# Altium footprint library PCB_PASSIVE.PcbLib: 100 footprints (part 3 of 7)
Each footprint in its own frame and in the unit in brackets; x right, y up, seen from the top. Pads: shape width x height; smd on the part's side, far side on the other; paste and mask are expansions set on the pad; w line width, h text height; cw(c..) or ccw(c..) is an arc to the next point about the centre after c.
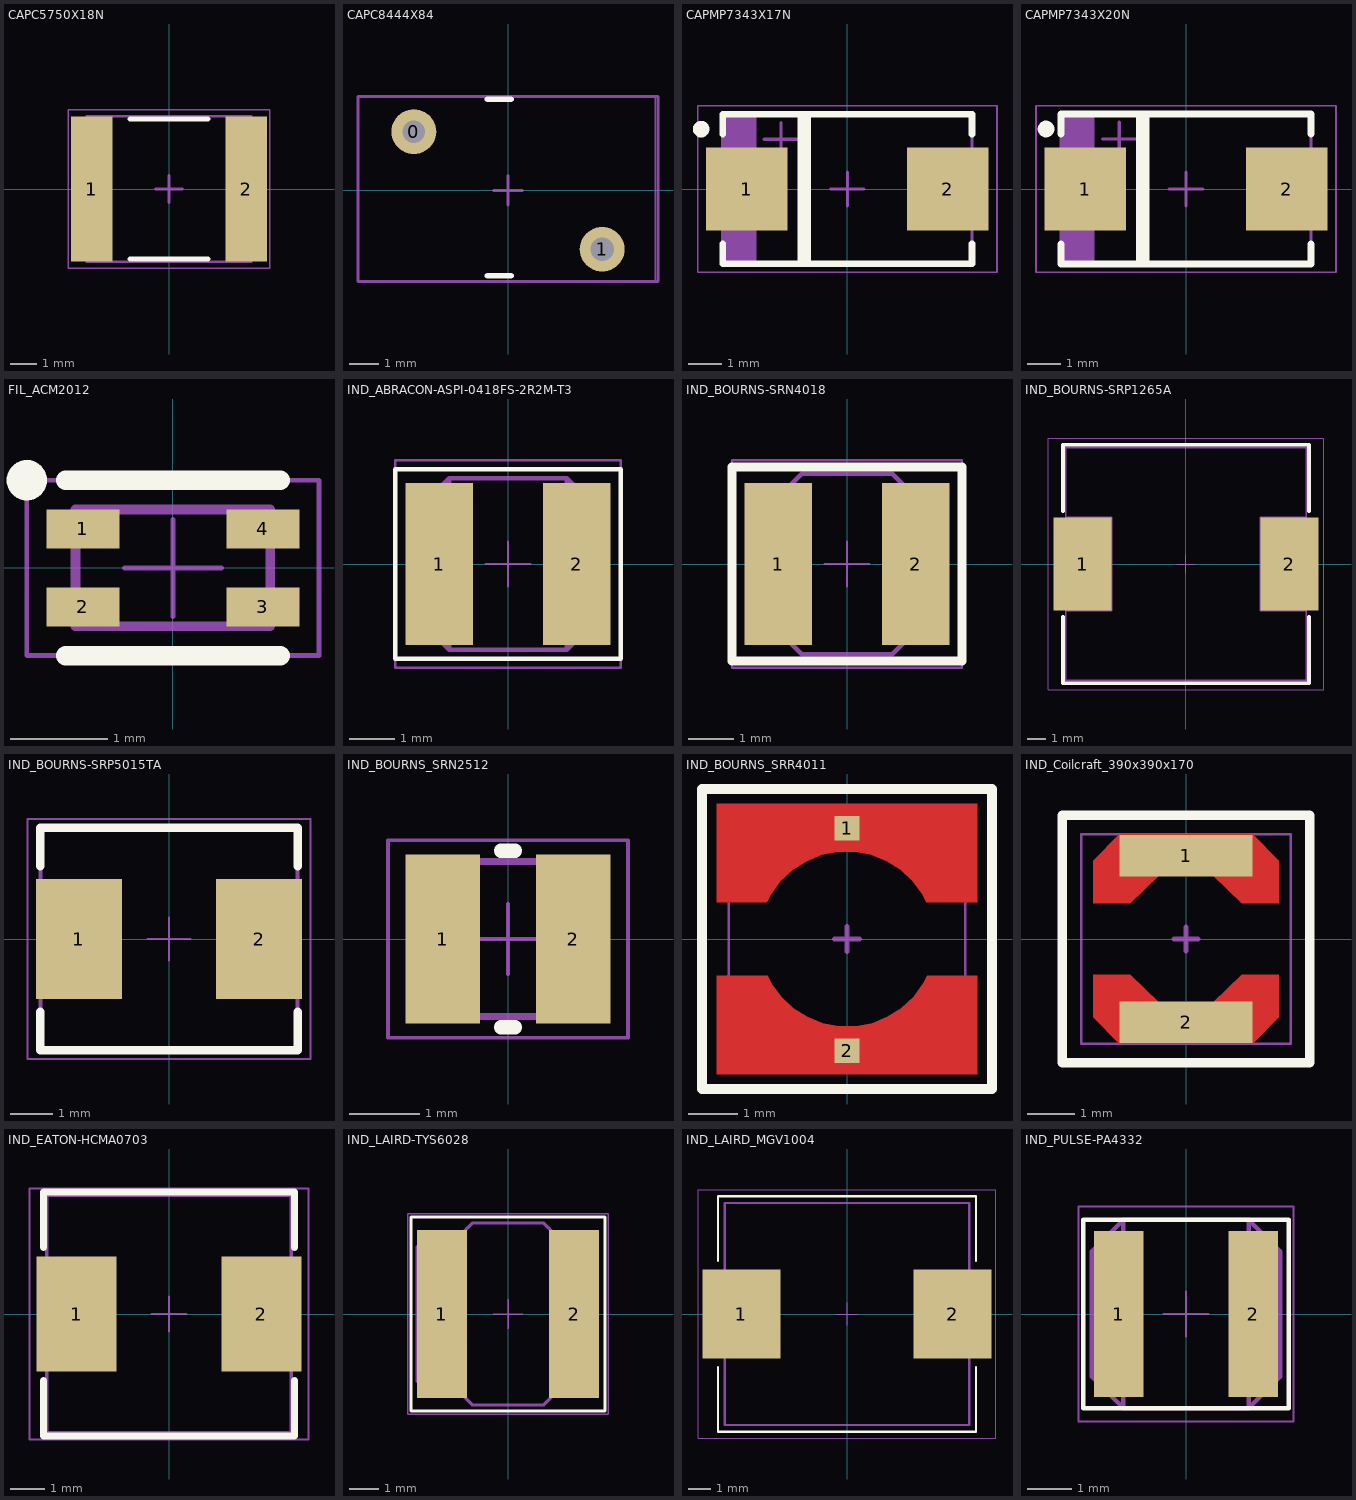
[diagram p2: the footprints below, top view; thin cyan lines are the x and y axes]

## CAPC5750X18N [mm] "Chip Capacitor, 2-Leads, Body 5,70x5,00mm, IPC Medium Density"
height 1.8
pads (2):
  rect 1.55x5.4 smd: 1(-2.875,0) 2(2.875,0)
Top Overlay:
  lines w0.2: -1.45,-2.6 1.45,-2.6 ; -1.45,2.6 1.45,2.6
Mechanical 11:
  text ".Designator" at -0.875,-0.525 h1
Mechanical 14:
  lines w0.1: -2.425,-2.7 -2.425,2.7 ; 2.425,-2.7 2.425,2.7 ; -3.05,-2.7 -3.05,2.7 3.05,2.7 3.05,-2.7 -3.05,-2.7
Mechanical 15:
  lines w0.05: -3.75,-2.95 -3.75,2.95 3.75,2.95 3.75,-2.95 -3.75,-2.95
  lines w0.1: -0.5,0 0.5,0 ; 0,-0.5 0,0.5
3D body "CAPC5750X18N.step": height 1.8, standoff 0, extent -3.05,-2.7 3.05,2.7

## CAPC8444X84 [mm]
pads (2):
  round 1.524 hole 0.762: 0(-3.2,2)
  round 1.524 hole 0.8: 1(3.2,-2)
Top Overlay:
  lines w0.2: -0.7,-2.9 0.1,-2.9 ; -0.7,3.1 0.1,3.1
Mechanical 11:
  text ".Bad" at -2.475,1.9 h1
Mechanical 14:
  lines w0.1: -5.1,-3.1 -5.1,3.2 5.1,3.2 5.1,-3.1 -5.1,-3.1
Mechanical 15:
  lines w0.05: -5.1,-3.1 -5.1,3.2 5,3.2 5,-3.1 -5.1,-3.1
  lines w0.1: -0.5,0 0.5,0 ; 0,-0.5 0,0.5

## CAPMP7343X17N [mm] "Molded Capacitor, 2-Leads, Body 7,30x4,30mm, IPC Medium Density"
height 1.7
pads (2):
  rect 2.45x2.5 smd: 1(-3.025,0) 2(3.025,0)
Top Overlay:
  circle w0.25: c-4.4,1.8 r0.125
  lines w0.2: -3.75,-1.65 -3.75,-2.25 3.75,-2.25 3.75,-1.65 ; -3.75,1.65 -3.75,2.25 3.75,2.25 3.75,1.65 ; -1.4,-2.2 -1.4,2.25 ; -1.2,-2.25 -1.2,2.25
Mechanical 11:
  text ".Designator" at -2.3,1.95 h1
Mechanical 14:
  rectangle: -3.75,-2.25 -2.741,2.25
  lines w0.1: -2.5,1.5 -2,1.5 ; -2,1 -2,1.5 ; -2,2 -2,1.5 ; -1.5,1.5 -2,1.5 ; -3.75,-2.25 -3.75,2.25 3.75,2.25 3.75,-2.25 -3.75,-2.25
Mechanical 15:
  lines w0.05: -4.5,-2.5 -4.5,2.5 4.5,2.5 4.5,-2.5 -4.5,-2.5
  lines w0.1: -0.5,0 0.5,0 ; 0,-0.5 0,0.5
3D body "CAPMP7343X17N.step": height 1.7, standoff 0, extent -3.97,-2.25 3.97,2.25

## CAPMP7343X20N [mm] "Molded Capacitor, 2-Leads, Body 7,30x4,30mm, IPC Medium Density"
height 2
pads (2):
  rect 2.45x2.5 smd: 1(-3.025,0) 2(3.025,0)
Top Overlay:
  circle w0.25: c-4.2,1.8 r0.125
  lines w0.2: -3.75,-1.65 -3.75,-2.25 3.75,-2.25 3.75,-1.65 ; -3.75,1.65 -3.75,2.25 3.75,2.25 3.75,1.65 ; -1.4,-2.2 -1.4,2.25 ; -1.2,-2.25 -1.2,2.25
Mechanical 11:
  text ".Designator" at -1.8,1.95 h1
Mechanical 14:
  rectangle: -3.75,-2.25 -2.741,2.25
  lines w0.1: -2.5,1.5 -2,1.5 ; -2,1 -2,1.5 ; -2,2 -2,1.5 ; -1.5,1.5 -2,1.5 ; -3.75,-2.25 -3.75,2.25 3.75,2.25 3.75,-2.25 -3.75,-2.25
Mechanical 15:
  lines w0.05: -4.5,-2.5 -4.5,2.5 4.5,2.5 4.5,-2.5 -4.5,-2.5
  lines w0.1: -0.5,0 0.5,0 ; 0,-0.5 0,0.5
3D body "Y__Y90.stp": height 1.89, standoff -0.01, extent -3.7,-2.225 3.7,2.225

## FIL_ACM2012 [mm]
pads (4):
  rect 0.75x0.4 smd mask+0.076: 1(-0.925,0.4) 2(-0.925,-0.4) 3(0.925,-0.4) 4(0.925,0.4)
Top Overlay:
  circle w0.254: c-1.5,0.9 r0.08
  lines w0.2: -1.1,-0.9 1.1,-0.9 ; -1.1,0.9 1.1,0.9
Mechanical 11:
  text ".Designator" at -1.2,1.2 h0.3
Mechanical 14:
  lines w0.1: -1,-0.6 1,-0.6 1,0.6 -1,0.6 -1,-0.6
Mechanical 15:
  lines w0.05: -0.5,0 0.5,0 ; 0,-0.5 0,0.5 ; -1.5,-0.9 1.5,-0.9 1.5,0.9 -1.5,0.9 -1.5,-0.9
3D body: height 1.3, standoff 0, extent -1,-0.6 1,0.6

## IND_ABRACON-ASPI-0418FS-2R2M-T3 [mm]
height 1.88
pads (2):
  rect 1.5x3.6 smd: 1(-1.525,0) 2(1.525,0)
Top Overlay:
  lines w0.1: -2.5,-2.1 0,-2.1 2.5,-2.1 2.5,2.1 0,2.1 -2.5,2.1 -2.5,-2.1
Mechanical 11:
  text ".Designator" at -1,-0.5 h1
Mechanical 14:
  lines w0.1: -1.9,-1.3 -1.3,-1.9 ; -1.9,-1.3 -1.3,-1.9 ; -1.9,-1.3 -1.9,1.3 -1.3,1.9 ; -1.3,-1.9 1.3,-1.9 ; -1.3,-1.9 -1.3,1.9 ; -1.3,1.9 1.3,1.9 ; 1.3,-1.9 1.9,-1.3 ; 1.3,-1.9 1.9,-1.3 ; 1.3,-1.9 1.3,1.9 ; 1.3,1.9 1.9,1.3 ; 1.3,1.9 1.9,1.3 ; 1.9,-1.3 1.9,1.3
Mechanical 15:
  lines w0.05: -0.5,0 0.5,0 ; 0,-0.5 0,0.5 ; -2.5,-2.3 -2.5,2.3 2.5,2.3 2.5,-2.3 -2.5,-2.3
3D body "ASPI-0418FS.STEP": height 1.81, standoff 0.01, extent -2,-2 2,2

## IND_BOURNS-SRN4018 [mm]
height 1.8
pads (2):
  rect 1.5x3.6 smd: 1(-1.525,0) 2(1.525,0)
Top Overlay:
  lines w0.2: -2.55,-2.15 -2.55,0 -2.55,2.15 -2.45,2.15 0,2.15 2.45,2.15 2.55,2.15 2.55,0 2.55,-2.15 2.45,-2.15 0,-2.15 -2.45,-2.15 -2.55,-2.15
Mechanical 11:
  text ".Designator" at -0.9,-0.35 h1
Mechanical 14:
  lines w0.1: -1.55,-1.45 -2.15,-1.45 -2.15,0 -2.15,1.45 -1.55,1.45 ; 1.55,-1.45 2.15,-1.45 2.15,0 2.15,1.45 1.55,1.45 ; -2,-1 -1,-2 0,-2 1,-2 2,-1 2,0 2,1 1,2 0,2 -1,2 -2,1 -2,0 -2,-1
Mechanical 15:
  lines w0.05: -0.5,0 0.5,0 ; 0,-0.5 0,0.5 ; -2.55,-2.3 0,-2.3 2.55,-2.3 2.55,0 2.55,2.3 0,2.3 -2.55,2.3 -2.55,0 -2.55,-2.3
3D body "srn4018.stp": height 1.81, standoff 0.01, extent -2.2,-2 2.2,2

## IND_BOURNS-SRP1265A [mm]
height 6.5
pads (2):
  rect 3.1x5 smd: 1(-5.55,0) 2(5.55,0)
Top Overlay:
  lines w0.2: -6.6,-2.85 -6.6,-6.4 -6.55,-6.4 0,-6.4 6.55,-6.4 6.6,-6.4 6.6,-2.85 ; -6.6,2.85 -6.6,6.4 -6.55,6.4 0,6.4 6.55,6.4 6.6,6.4 6.6,2.85
Mechanical 11:
  text ".Designator" at -3.9,-0.3 h1
Mechanical 14:
  lines w0.1: -6.45,-2.5 -4,-2.5 -4,2.5 -6.45,2.5 ; 6.45,-2.5 4,-2.5 4,2.5 6.45,2.5 ; -6.45,-6.25 6.45,-6.25 6.45,6.25 -6.45,6.25 -6.45,-6.25
Mechanical 15:
  lines w0.05: -0.5,0 0.5,0 ; 0,-0.5 0,0.5 ; -7.4,-6.75 0,-6.75 7.4,-6.75 7.4,6.75 0,6.75 -7.4,6.75 -7.4,-6.75
3D body "SRP1265A series.stp": height 6.32, standoff 0.01, extent -6.45,-6.25 6.45,6.25

## IND_BOURNS-SRP5015TA [mm]
height 1.5
pads (2):
  rect 2x2.8 smd: 1(-2.1,0) 2(2.1,0)
Top Overlay:
  lines w0.2: -3,-1.7 -3,-2.6 3,-2.6 3,-1.7 ; -3,1.7 -3,2.6 3,2.6 3,1.7
Mechanical 11:
  text ".Designator" at -1.6,-0.1 h1
Mechanical 14:
  lines w0.1: -3,-0.8 -2.2,-0.8 -2.2,0.8 -3,0.8 ; 3,-0.8 2.2,-0.8 2.2,0.8 3,0.8 ; -3,-2.6 3,-2.6 3,2.6 -3,2.6 -3,-2.6
Mechanical 15:
  lines w0.05: -0.5,0 0,0 ; 0,-0.5 0,0 ; 0,0.5 0,0 ; 0.5,0 0,0 ; -3.3,-2.8 -3.3,2.8 3.3,2.8 3.3,-2.8 -3.3,-2.8
3D body: height 1.5, standoff 0, extent -3,-2.6 3,2.6

## IND_BOURNS_SRN2512 [mm]
height 1.2
pads (2):
  rect 1.05x2.4 smd: 1(-0.925,0) 2(0.925,0)
Top Overlay:
  lines w0.2: -0.1,-1.25 0.1,-1.25 ; -0.1,1.25 0.1,1.25
Mechanical 11:
  text ".Designator" at -1,-0.5 h1
Mechanical 14:
  lines w0.1: -0.8,-1.1 -0.8,1.1 ; 0.8,-1.1 0.8,1.1 ; -1.3,-1.1 -1.3,1.1 1.3,1.1 1.3,-1.1 -1.3,-1.1
Mechanical 15:
  lines w0.05: -0.5,0 0.5,0 ; 0,-0.5 0,0.5 ; -1.7,-1.4 -1.7,1.4 1.7,1.4 1.7,-1.4 -1.7,-1.4
3D body: height 1.2, standoff 0, extent -1.25,-1 1.25,1

## IND_BOURNS_SRR4011 [mm] "INDUCTOR SRR4011 SERIES, 480X480X130"
height 1.3
pads (2):
  rect 0.5x0.5 smd: 1(0,2.25) 2(0,-2.275)
Top Layer:
  region: -2.65,0.75 -2.65,2.75 2.65,2.75 2.65,0.75 1.616,0.75 1.537,0.9 1.339,1.173 1.092,1.404 0.807,1.586 0.493,1.71 0.161,1.774 -0.177,1.774 -0.509,1.71 -0.823,1.586 -1.108,1.404 -1.354,1.173 -1.553,0.9 -1.632,0.75
  region: 2.65,-0.75 2.65,-2.75 -2.65,-2.75 -2.65,-0.75 -1.616,-0.75 -1.537,-0.9 -1.339,-1.173 -1.092,-1.404 -0.807,-1.586 -0.493,-1.71 -0.161,-1.774 0.177,-1.774 0.509,-1.71 0.823,-1.586 1.108,-1.404 1.354,-1.173 1.553,-0.9 1.632,-0.75
Top Overlay:
  lines w0.2: -2.95,-3.05 2.95,-3.05 2.95,3.05 -2.95,3.05 -2.95,-3.05
Mechanical 11:
  text ".Designator" at -2.9,3.675 h1
Mechanical 14:
  lines w0.05: -2.4,-2.4 -2.4,2.4 2.4,2.4 2.4,-2.4 -2.4,-2.4
Mechanical 15:
  lines w0.05: -2.875,-2.975 -2.875,2.975 2.875,2.975 2.875,-2.975 -2.875,-2.975
  lines w0.1: -0.25,0 0.25,0 ; 0,-0.25 0,0.25
3D body "srr4011.stp": height 1.25, standoff 0.1, extent -2.4,-2.4 2.4,2.4

## IND_Coilcraft_390x390x170 [mm] "INDUCTOR SRR4011 SERIES, 480X480X130"
height 1.3
pads (2):
  rect 2.8x0.87 smd: 1(0,1.75) 2(0,-1.75)
Top Layer:
  region: -1.4,2.2 1.4,2.2 1.95,1.64 1.95,0.75 1.175,0.75 0.575,1.33 -0.575,1.33 -1.175,0.75 -1.95,0.75 -1.95,1.64
  region: 1.4,-2.2 -1.4,-2.2 -1.95,-1.64 -1.95,-0.75 -1.175,-0.75 -0.575,-1.33 0.575,-1.33 1.175,-0.75 1.95,-0.75 1.95,-1.64
Top Overlay:
  lines w0.2: -2.6,-2.6 2.6,-2.6 2.6,2.6 -2.6,2.6 -2.6,-2.6
Mechanical 11:
  text ".Designator" at -2.9,3.675 h1
Mechanical 14:
  lines w0.05: -2.2,-2.2 -2.2,2.2 2.2,2.2 2.2,-2.2 -2.2,-2.2
Mechanical 15:
  lines w0.05: -2.6,-2.6 -2.6,2.6 2.6,2.6 2.6,-2.6 -2.6,-2.6
  lines w0.1: -0.25,0 0.25,0 ; 0,-0.25 0,0.25
3D body "ind.stp": height 1.7, standoff 0, extent -1.95,-1.95 1.95,1.95

## IND_EATON-HCMA0703 [mm]
height 3
pads (2):
  rect 2.3x3.3 smd: 1(-2.65,0) 2(2.65,0)
Top Overlay:
  lines w0.2: -3.6,-1.9 -3.6,-3.5 -0.1,-3.5 3.6,-3.5 3.6,-1.9 ; -3.6,1.9 -3.6,3.5 0.1,3.5 3.6,3.5 3.6,1.9
Mechanical 11:
  text ".Designator" at -1,-0.5 h1
Mechanical 14:
  lines w0.1: -3.5,-1.5 -2,-1.5 -2,1.5 -3.5,1.5 ; 3.5,-1.5 2,-1.5 2,1.5 3.5,1.5 ; -3.5,-3.4 3.5,-3.4 3.5,3.4 -3.5,3.4 -3.5,-3.4
Mechanical 15:
  lines w0.05: -0.5,0 0.5,0 ; 0,-0.5 0,0.5 ; -4,-3.6 -4,3.6 4,3.6 4,-3.6 -4,-3.6
3D body: height 3, standoff 0, extent -3.55,-3.4 3.55,3.4

## IND_LAIRD-TYS6028 [mm]
height 2.8
pads (2):
  rect 1.7x5.7 smd: 1(-2.25,0) 2(2.25,0)
Top Overlay:
  lines w0.1: -3.3,-3.3 -3.3,3.3 3.3,3.3 3.3,-3.3 -3.3,-3.3
Mechanical 11:
  text ".Designator" at -1,-0.5 h1
Mechanical 14:
  lines w0.1: -3.1,-2.3 -3.1,2.3 -2,2.3 -1.2,3.1 1.2,3.1 2,2.3 3,2.3 3,-2.3 2,-2.3 1.2,-3.1 -1.2,-3.1 -2,-2.3 -3.1,-2.3
Mechanical 15:
  lines w0.05: -0.5,0 0.5,0 ; 0,-0.5 0,0.5 ; -3.4,-3.4 -3.4,3.4 3.4,3.4 3.4,-3.4 -3.4,-3.4
3D body: height 2.8, standoff 0, extent -3.15,-3.15 3.15,3.15

## IND_LAIRD_MGV1004 [mm]
height 4
pads (2):
  rect 3.5x4 smd: 1(-4.75,0) 2(4.75,0)
Top Overlay:
  lines w0.1: -5.8,-2.4 -5.8,-5.3 5.8,-5.3 5.8,-2.4 ; -5.8,2.4 -5.8,5.3 5.8,5.3 5.8,2.4
Mechanical 11:
  text ".Designator" at -1,-0.5 h1
Mechanical 14:
  lines w0.1: -5.5,-1.6 -3.7,-1.6 -3.7,0 -3.7,1.6 -5.5,1.6 ; 5.5,-1.6 3.7,-1.6 3.7,0 3.7,1.6 5.5,1.6 ; -5.5,-5 -5.5,5 5.5,5 5.5,-5 -5.5,-5
Mechanical 15:
  lines w0.05: -0.5,0 0.5,0 ; 0,-0.5 0,0.5 ; -6.7,-5.6 6.7,-5.6 6.7,0 6.7,5.6 -6.7,5.6 -6.7,0 -6.7,-5.6
3D body: height 4, standoff 0, extent -5.5,-5 5.5,5

## IND_PULSE-PA4332 [mm]
height 2
pads (2):
  rect 1.1x3.7 smd: 1(-1.5,0) 2(1.5,0)
Top Overlay:
  lines w0.1: -2.3,-2.1 0,-2.1 2.3,-2.1 2.3,2.1 -2.3,2.1 -2.3,-2.1
Mechanical 11:
  text ".Designator" at -1,-0.5 h1
Mechanical 14:
  lines w0.1: -1.4,-2.1 -1.4,2.1 ; -1.4,-2.1 -2.1,-1.4 -2.1,0 -2.1,1.4 -1.4,2.1 ; -1.4,-2.1 0,-2.1 1.4,-2.1 ; -1.4,2.1 0,2.1 1.4,2.1 ; 1.4,-2.1 1.4,2.1 ; 1.4,-2.1 2.1,-1.4 2.1,0 2.1,1.4 1.4,2.1
Mechanical 15:
  lines w0.05: -0.5,0 0.5,0 ; 0,-0.5 0,0.5 ; -2.4,-2.4 2.4,-2.4 2.4,2.4 -2.4,2.4 -2.4,-2.4
3D body: height 2, standoff 0, extent -2.1,-2.1 2.1,2.1